# Altium footprint library Res.PcbLib: 49 footprints (part 4 of 4)
Each footprint in its own frame and in the unit in brackets; x right, y up, seen from the top. Pads: shape width x height; smd on the part's side, far side on the other; paste and mask are expansions set on the pad; w line width, h text height; cw(c..) or ccw(c..) is an arc to the next point about the centre after c.
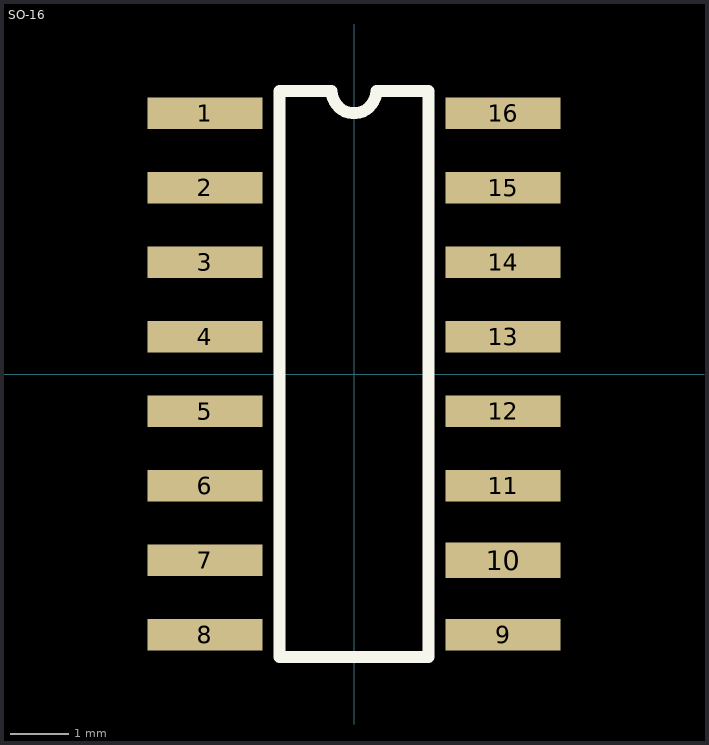
[diagram p3: the footprint, top view; thin cyan lines are the x and y axes]

## SO-16 [mil] "Small Outline IC 16pin"
height 60
pads (16):
  rect 77x21 smd: 1(-100,175) 2(-100,125) 3(-100,75) 4(-100,25) 5(-100,-25) 6(-100,-75) 7(-100,-125) 8(-100,-175) 9(100,-175) 11(100,-75) 12(100,-25) 13(100,25) 14(100,75) 15(100,125) 16(100,175)
  rect 77x24 smd: 10(100,-125)
Top Overlay:
  lines w8: -50,-190 50,-190 50,190 15,190 cw(c0,190) -15,190 -50,190 -50,-190
3D body "SMD_SO-16.STEP": height 68.45, standoff -0.98, extent -120.8,-196.26 120.81,196.26